# Altium footprint library 691 322 310 0xx.PcbLib: 23 footprints (part 1 of 2)
Each footprint in its own frame and in the unit in brackets; x right, y up, seen from the top. Pads: shape width x height; smd on the part's side, far side on the other; paste and mask are expansions set on the pad; w line width, h text height; cw(c..) or ccw(c..) is an arc to the next point about the centre after c.
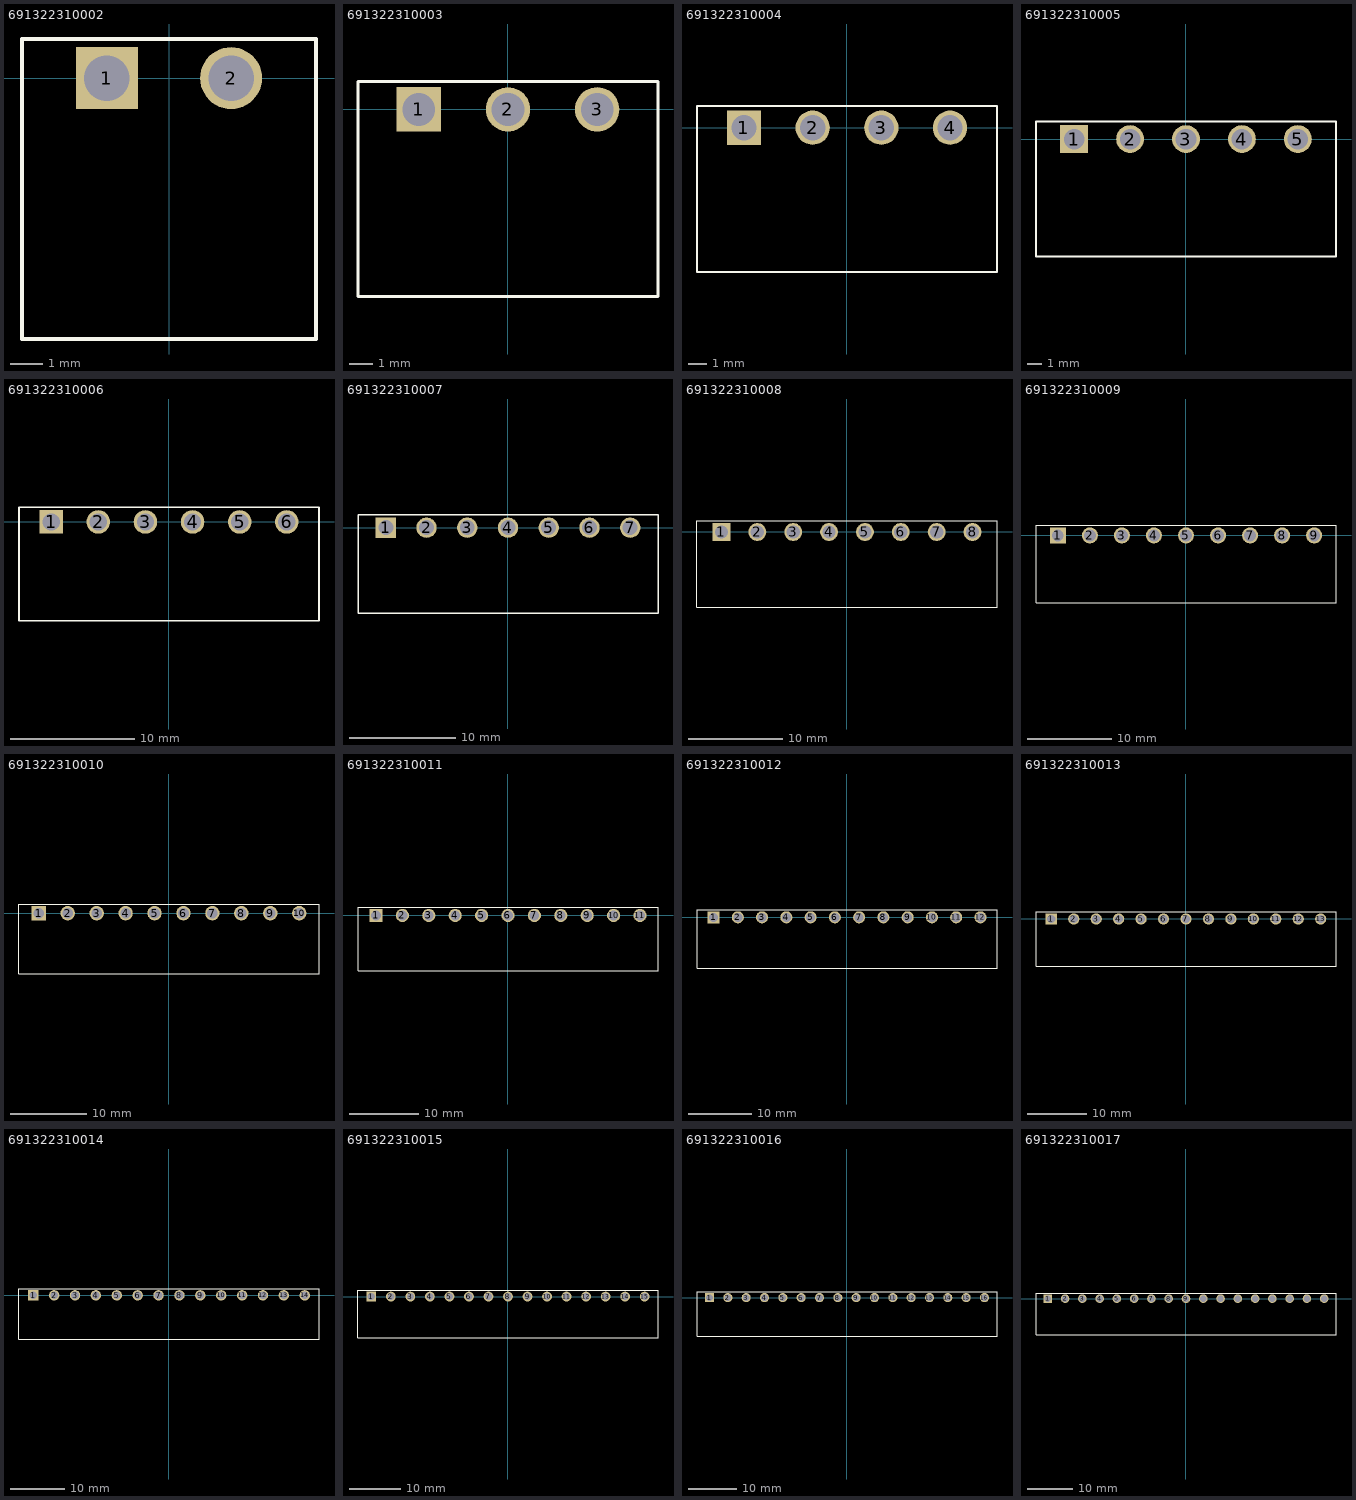
[diagram p0: the footprints below, top view; thin cyan lines are the x and y axes]

## 691322310002 [mm] "3,81mm - PCB Headers - Horizontal - 02p"
height 7
pads (2):
  rect 1.9x1.9 hole 1.4: 1(-1.905,0)
  round 1.9 hole 1.4: 2(1.905,0)
Top Overlay:
  lines w0.127: -4.505,-8 4.505,-8 4.505,1.2 -4.505,1.2 -4.505,-8
3D body: height 7.21, standoff -3.49, extent -4.405,-8 4.405,1.2

## 691322310003 [mm] "3,81mm - PCB Headers - Horizontal - 03p"
height 7
pads (3):
  rect 1.9x1.9 hole 1.4: 1(-3.81,0)
  round 1.9 hole 1.4: 2(0,0) 3(3.81,0)
Top Overlay:
  lines w0.127: -6.41,-8 6.41,-8 6.41,1.2 -6.41,1.2 -6.41,-8
3D body: height 7.21, standoff -3.49, extent -6.31,-8 6.31,1.2

## 691322310004 [mm] "3,81mm - PCB Headers - Horizontal - 04p"
height 7
pads (4):
  rect 1.9x1.9 hole 1.4: 1(-5.715,0)
  round 1.9 hole 1.4: 2(-1.905,0) 3(1.905,0) 4(5.715,0)
Top Overlay:
  lines w0.127: -8.315,-8 8.315,-8 8.315,1.2 -8.315,1.2 -8.315,-8
3D body: height 7.21, standoff -3.49, extent -8.215,-8 8.215,1.2

## 691322310005 [mm] "3,81mm - PCB Headers - Horizontal - 05p"
height 7
pads (5):
  rect 1.9x1.9 hole 1.4: 1(-7.62,0)
  round 1.9 hole 1.4: 2(-3.81,0) 3(0,0) 4(3.81,0) 5(7.62,0)
Top Overlay:
  lines w0.127: -10.22,-8 10.22,-8 10.22,1.2 -10.22,1.2 -10.22,-8
3D body: height 7.21, standoff -3.49, extent -10.12,-8 10.12,1.2

## 691322310006 [mm] "3,81mm - PCB Headers - Horizontal - 06p"
height 7
pads (6):
  rect 1.9x1.9 hole 1.4: 1(-9.525,0)
  round 1.9 hole 1.4: 2(-5.715,0) 3(-1.905,0) 4(1.905,0) 5(5.715,0) 6(9.525,0)
Top Overlay:
  lines w0.127: -12.125,-8 12.125,-8 12.125,1.2 -12.125,1.2 -12.125,-8
3D body: height 7.21, standoff -3.49, extent -12.025,-8 12.025,1.2

## 691322310007 [mm] "3,81mm - PCB Headers - Horizontal - 07p"
height 7
pads (7):
  rect 1.9x1.9 hole 1.4: 1(-11.43,0)
  round 1.9 hole 1.4: 2(-7.62,0) 3(-3.81,0) 4(0,0) 5(3.81,0) 6(7.62,0) 7(11.43,0)
Top Overlay:
  lines w0.127: -14.03,-8 14.03,-8 14.03,1.2 -14.03,1.2 -14.03,-8
3D body: height 7.21, standoff -3.49, extent -13.93,-8 13.93,1.2

## 691322310008 [mm] "3,81mm - PCB Headers - Horizontal - 08p"
height 7
pads (8):
  rect 1.9x1.9 hole 1.4: 1(-13.335,0)
  round 1.9 hole 1.4: 2(-9.525,0) 3(-5.715,0) 4(-1.905,0) 5(1.905,0) 6(5.715,0) 7(9.525,0) 8(13.335,0)
Top Overlay:
  lines w0.127: -15.935,-8 -15.935,1.2 15.935,1.2 15.935,-8 -15.935,-8
3D body: height 7.21, standoff -3.49, extent -15.835,-8 15.835,1.2

## 691322310009 [mm] "3,81mm - PCB Headers - Horizontal - 09p"
height 7
pads (9):
  rect 1.9x1.9 hole 1.4: 1(-15.24,0)
  round 1.9 hole 1.4: 2(-11.43,0) 3(-7.62,0) 4(-3.81,0) 5(0,0) 6(3.81,0) 7(7.62,0) 8(11.43,0) 9(15.24,0)
Top Overlay:
  lines w0.127: -17.84,-8 -17.84,1.2 17.84,1.2 17.84,-8 -17.84,-8
3D body: height 7.21, standoff -3.49, extent -17.74,-8 17.74,1.2

## 691322310010 [mm] "3,81mm - PCB Headers - Horizontal - 10p"
height 7
pads (10):
  rect 1.9x1.9 hole 1.4: 1(-17.145,0)
  round 1.9 hole 1.4: 2(-13.335,0) 3(-9.525,0) 4(-5.715,0) 5(-1.905,0) 6(1.905,0) 7(5.715,0) 8(9.525,0) 9(13.335,0) 10(17.145,0)
Top Overlay:
  lines w0.127: -19.745,-8 -19.745,1.2 19.745,1.2 19.745,-8 -19.745,-8
3D body: height 7.21, standoff -3.49, extent -19.645,-8 19.645,1.2

## 691322310011 [mm] "3,81mm - PCB Headers - Horizontal - 11p"
height 7
pads (11):
  rect 1.9x1.9 hole 1.4: 1(-19.05,0)
  round 1.9 hole 1.4: 2(-15.24,0) 3(-11.43,0) 4(-7.62,0) 5(-3.81,0) 6(0,0) 7(3.81,0) 8(7.62,0) 9(11.43,0) 10(15.24,0) 11(19.05,0)
Top Overlay:
  lines w0.127: -21.65,-8 -21.65,1.2 21.65,1.2 21.65,-8 -21.65,-8
3D body: height 7.21, standoff -3.49, extent -21.55,-8 21.55,1.2

## 691322310012 [mm] "3,81mm - PCB Headers - Horizontal - 12p"
height 7
pads (12):
  rect 1.9x1.9 hole 1.4: 1(-20.955,0)
  round 1.9 hole 1.4: 2(-17.145,0) 3(-13.335,0) 4(-9.525,0) 5(-5.715,0) 6(-1.905,0) 7(1.905,0) 8(5.715,0) 9(9.525,0) 10(13.335,0) 11(17.145,0) 12(20.955,0)
Top Overlay:
  lines w0.127: -23.555,-8 -23.555,1.2 23.555,1.2 23.555,-8 -23.555,-8
3D body: height 7.21, standoff -3.49, extent -23.455,-8 23.455,1.2

## 691322310013 [mm] "3,81mm - PCB Headers - Horizontal - 13p"
height 7
pads (13):
  rect 1.9x1.9 hole 1.4: 1(-22.86,0)
  round 1.9 hole 1.4: 2(-19.05,0) 3(-15.24,0) 4(-11.43,0) 5(-7.62,0) 6(-3.81,0) 7(0,0) 8(3.81,0) 9(7.62,0) 10(11.43,0) 11(15.24,0) 12(19.05,0) 13(22.86,0)
Top Overlay:
  lines w0.127: -25.46,-8 -25.46,1.2 25.46,1.2 25.46,-8 -25.46,-8
3D body: height 7.21, standoff -3.49, extent -25.36,-8 25.36,1.2

## 691322310014 [mm] "3,81mm - PCB Headers - Horizontal - 14p"
height 7
pads (14):
  rect 1.9x1.9 hole 1.4: 1(-24.765,0)
  round 1.9 hole 1.4: 2(-20.955,0) 3(-17.145,0) 4(-13.335,0) 5(-9.525,0) 6(-5.715,0) 7(-1.905,0) 8(1.905,0) 9(5.715,0) 10(9.525,0) 11(13.335,0) 12(17.145,0) 13(20.955,0) 14(24.765,0)
Top Overlay:
  lines w0.127: -27.365,-8 -27.365,1.2 27.365,1.2 27.365,-8 -27.365,-8
3D body: height 7.21, standoff -3.49, extent -27.265,-8 27.265,1.2

## 691322310015 [mm] "3,81mm - PCB Headers - Horizontal - 15p"
height 7
pads (15):
  rect 1.9x1.9 hole 1.4: 1(-26.67,0)
  round 1.9 hole 1.4: 2(-22.86,0) 3(-19.05,0) 4(-15.24,0) 5(-11.43,0) 6(-7.62,0) 7(-3.81,0) 8(0,0) 9(3.81,0) 10(7.62,0) 11(11.43,0) 12(15.24,0) 13(19.05,0) 14(22.86,0) 15(26.67,0)
Top Overlay:
  lines w0.127: -29.27,-8 29.27,-8 29.27,1.2 -29.27,1.2 -29.27,-8
3D body: height 7.21, standoff -3.49, extent -29.17,-8 29.17,1.2

## 691322310016 [mm] "3,81mm - PCB Headers - Horizontal - 16p"
height 7
pads (16):
  rect 1.9x1.9 hole 1.4: 1(-28.575,0)
  round 1.9 hole 1.4: 2(-24.765,0) 3(-20.955,0) 4(-17.145,0) 5(-13.335,0) 6(-9.525,0) 7(-5.715,0) 8(-1.905,0) 9(1.905,0) 10(5.715,0) 11(9.525,0) 12(13.335,0) 13(17.145,0) 14(20.955,0) 15(24.765,0) 16(28.575,0)
Top Overlay:
  lines w0.127: -31.175,-8 -31.175,1.2 31.175,1.2 31.175,-8 -31.175,-8
3D body: height 7.21, standoff -3.49, extent -31.075,-8 31.075,1.2

## 691322310017 [mm] "3,81mm - PCB Headers - Horizontal - 17p"
height 7
pads (17):
  rect 1.9x1.9 hole 1.4: 1(-30.48,0)
  round 1.9 hole 1.4: 2(-26.67,0) 3(-22.86,0) 4(-19.05,0) 5(-15.24,0) 6(-11.43,0) 7(-7.62,0) 8(-3.81,0) 9(0,0) 10(3.81,0) 11(7.62,0) 12(11.43,0) 13(15.24,0) 14(19.05,0) 15(22.86,0) 16(26.67,0) 17(30.48,0)
Top Overlay:
  lines w0.127: -33.08,-8 -33.08,1.2 33.08,1.2 33.08,-8 -33.08,-8
3D body: height 7.21, standoff -3.49, extent -32.98,-8 32.98,1.2